# Altium footprint library ALL.PcbLib: 385 footprints (part 11 of 25)
Each footprint in its own frame and in the unit in brackets; x right, y up, seen from the top. Pads: shape width x height; smd on the part's side, far side on the other; paste and mask are expansions set on the pad; w line width, h text height; cw(c..) or ccw(c..) is an arc to the next point about the centre after c.
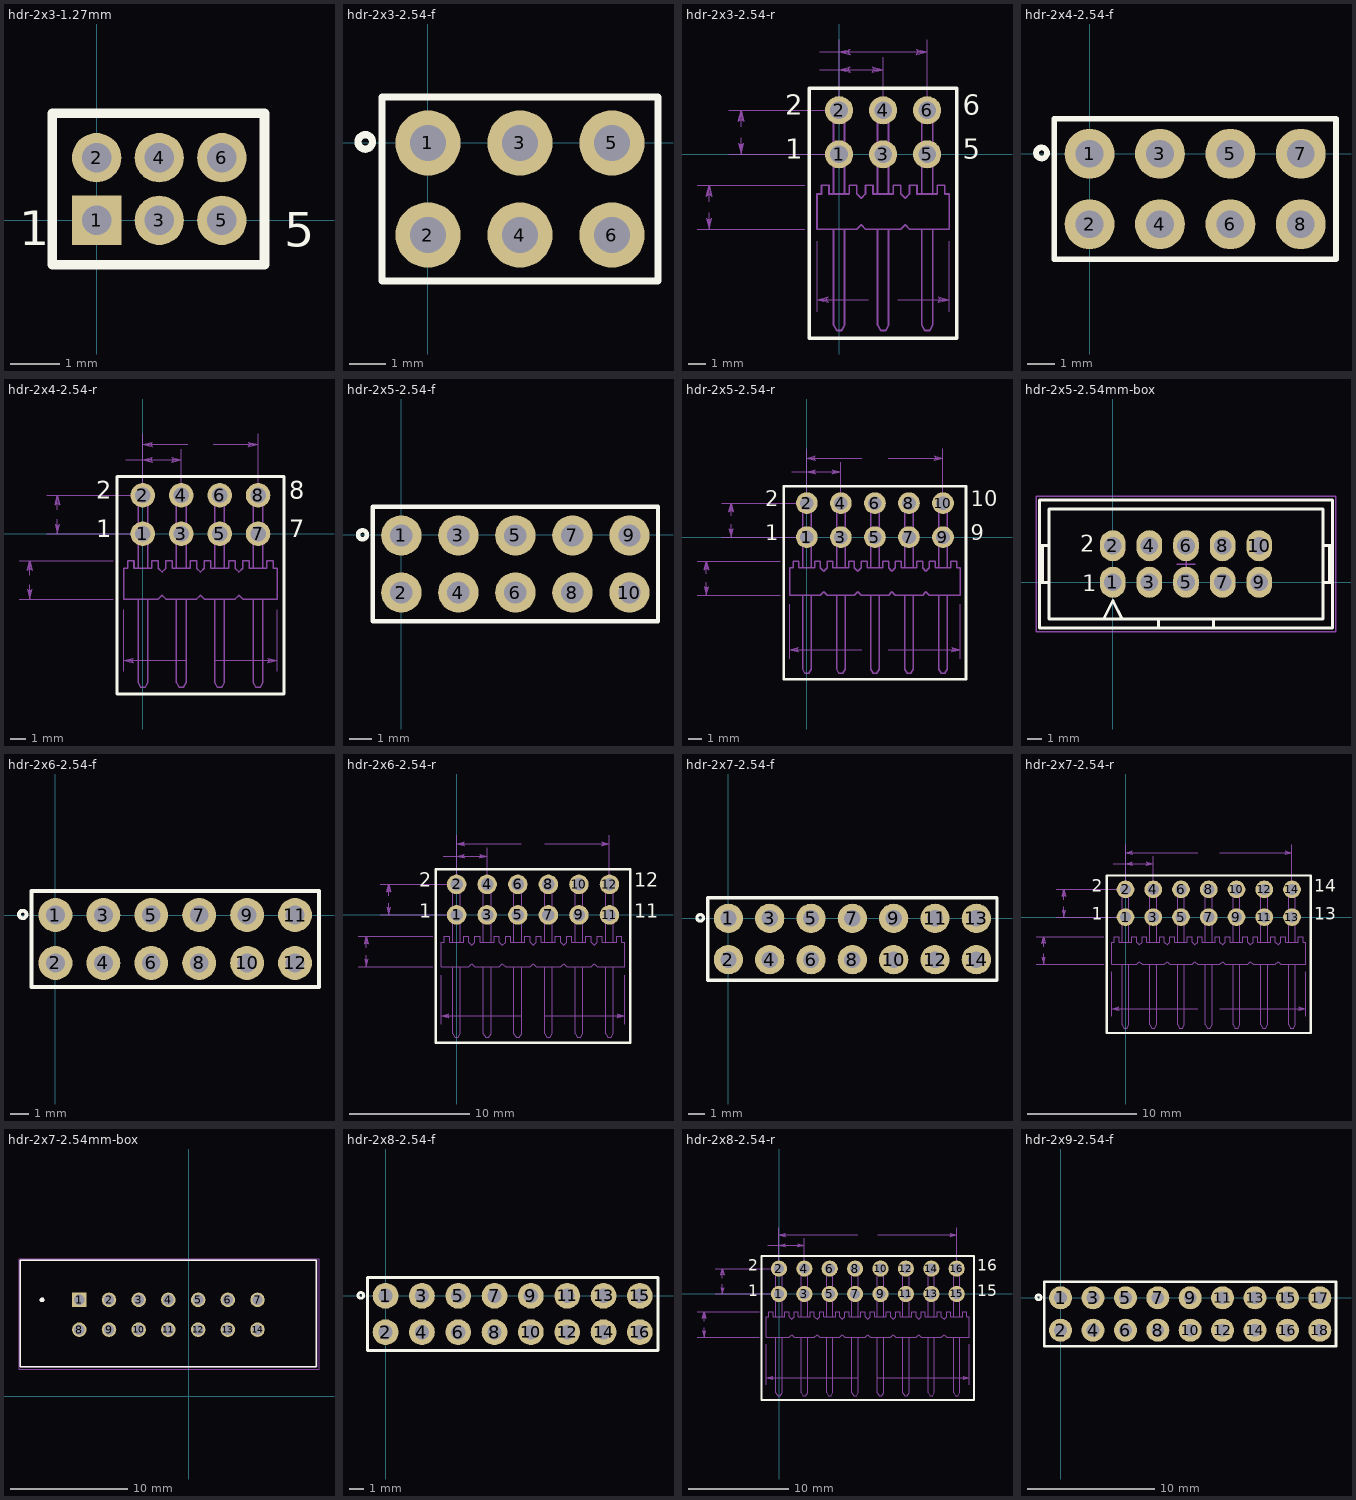
[diagram p10: the footprints below, top view; thin cyan lines are the x and y axes]

## hdr-2x3-1.27mm [mm]
pads (6):
  rect 1x1 hole 0.6: 1(0,0)
  round 1 hole 0.6: 2(0,1.27) 3(1.27,0) 4(1.27,1.27) 5(2.54,0) 6(2.54,1.27)
Top Overlay:
  lines w0.2: -0.9,-0.9 -0.9,2.17 3.404,2.17 3.404,-0.9 -0.9,-0.9
  text "1" at -1.575,-0.508 h0.7
  text "5" at 3.81,-0.533 h0.7
3D body "User Library-PLS6_2_1p27-1.STEP": height 4, standoff -2.3, extent -0.635,-1.09 3.175,2.31

## hdr-2x3-2.54-f [mm]
pads (6):
  round 1.8 hole 1: 1(0,0) 2(0,-2.54) 3(2.54,0) 4(2.54,-2.54) 5(5.08,0) 6(5.08,-2.54)
Top Overlay:
  circle w0.2: c-1.73,0.03 r0.2
  lines w0.2: -1.27,-3.81 -1.27,1.27 6.35,1.27 6.35,-3.81 -1.27,-3.81
3D body "PBD-2.stp": height 8.5, standoff -3.15, extent 3.81,-3.81 6.35,1.27
3D body "PBD-2.stp": height 8.5, standoff -3.15, extent -1.27,-3.81 1.27,1.27
3D body "PBD-2.stp": height 8.5, standoff -3.15, extent 1.27,-3.81 3.81,1.27

## hdr-2x3-2.54-r [mm]
pads (6):
  round 1.62 hole 1.02: 1(0,0) 2(0,2.54) 3(2.54,0) 4(2.54,2.54) 5(5.08,0) 6(5.08,2.54)
Top Overlay:
  lines w0.2: -1.72,-10.61 -1.72,3.801 6.8,3.801 6.8,-10.61 -1.72,-10.61
  text "1" at -3.09,-0.635 h1.97
  text "2" at -3.09,1.905 h1.97
  text "5" at 7.141,-0.635 h1.97
  text "6" at 7.141,1.905 h1.97
Top Solder:
  circle w0: c0,0 r0.861
  circle w0: c0,2.54 r0.861
  circle w0: c2.54,0 r0.861
  circle w0: c2.54,2.54 r0.861
  circle w0: c5.08,0 r0.861
  circle w0: c5.08,2.54 r0.861
Bottom Solder:
  circle w0: c0,0 r0.861
  circle w0: c0,2.54 r0.861
  circle w0: c2.54,0 r0.861
  circle w0: c2.54,2.54 r0.861
  circle w0: c5.08,0 r0.861
  circle w0: c5.08,2.54 r0.861
Mechanical 16:
  lines w0.1: -0.318,-4.318 -0.318,-9.855 -0.141,-10.16 0.141,-10.16 0.318,-9.855 0.318,-4.318 ; -0.318,-2.286 -0.318,2.596 0.318,2.596 0.318,-2.286 ; 2.222,-4.318 2.222,-9.855 2.399,-10.16 2.681,-10.16 2.858,-9.855 2.858,-4.318 ; 2.222,-2.286 2.222,2.596 2.858,2.596 2.858,-2.286 ; 4.762,-2.286 4.762,2.596 5.398,2.596 5.398,-2.286 ; 4.762,-4.318 4.762,-9.855 4.939,-10.16 5.221,-10.16 5.398,-9.855 5.398,-4.318 ; 4.762,-4.318 4.064,-4.318 3.81,-4.064 3.556,-4.318 1.524,-4.318 1.27,-4.064 1.016,-4.318 -1.27,-4.318 -1.27,-2.286 -1.016,-2.286 -1.016,-1.778 -0.587,-1.778 -0.587,-2.286 0.587,-2.286 0.587,-1.778 1.016,-1.778 1.016,-2.286 1.27,-2.54 1.524,-2.286 1.524,-1.778 1.953,-1.778 1.953,-2.286 3.127,-2.286 3.127,-1.778 3.556,-1.778 3.556,-2.286 3.81,-2.54 4.064,-2.286 4.064,-1.778 4.493,-1.778 4.493,-2.286 5.667,-2.286 5.667,-1.778 6.096,-1.778 6.096,-2.286 6.35,-2.286 6.35,-4.318 5.398,-4.318 ; 4.762,-4.318 5.398,-4.318
  text "1" at -3.09,-0.635 h1.97
  text "2" at -3.09,1.905 h1.97
  text "5" at 7.141,-0.635 h1.97
  text "6" at 7.141,1.905 h1.97
Mechanical 40:
  lines w0: -8.194,-4.318 -1.971,-4.318 ; -8.194,-1.778 -1.971,-1.778 ; -7.493,-3.366 -7.493,-4.318 ; -7.493,-2.73 -7.493,-1.778 ; -6.353,0 -0.701,0 ; -6.353,2.54 -0.701,2.54 ; -5.652,0.952 -5.652,0 ; -5.652,1.588 -5.652,2.54 ; -1.27,-9.083 -1.27,-5.019 ; -1.118,4.89 0,4.89 ; -1.118,5.906 0,5.906 ; 0,5.591 0,3.241 0,6.607 ; 1.689,-8.382 -1.27,-8.382 ; 2.54,3.241 2.54,5.591 ; 3.391,-8.382 6.35,-8.382 ; 5.08,3.241 5.08,6.607 ; 6.35,-9.083 6.35,-5.019 ; -7.652,-3.683 -7.493,-4.318 ; -7.652,-3.683 -7.493,-3.81 ; -7.652,-3.683 -7.572,-3.746 -7.493,-4.318 ; -7.493,-4.318 -7.334,-3.683 -7.493,-3.81 ; -7.493,-4.318 -7.414,-3.746 -7.493,-3.81 ; -7.493,-4.318 -7.493,-3.81 ; -7.493,-2.286 -7.652,-2.413 -7.493,-1.778 ; -7.493,-2.286 -7.334,-2.413 ; -7.493,-2.286 -7.572,-2.35 -7.493,-1.778 ; -7.493,-2.286 -7.493,-1.778 ; -7.493,-1.778 -7.334,-2.413 ; -7.493,-1.778 -7.414,-2.35 -7.334,-2.413 ; -5.81,0.635 -5.652,0 ; -5.81,0.635 -5.652,0.508 ; -5.81,0.635 -5.731,0.572 -5.652,0 ; -5.652,0 -5.493,0.635 -5.652,0.508 ; -5.652,0 -5.572,0.572 -5.652,0.508 ; -5.652,0 -5.652,0.508 ; -5.652,2.032 -5.81,1.905 -5.652,2.54 ; -5.652,2.032 -5.493,1.905 ; -5.652,2.032 -5.731,1.968 -5.652,2.54 ; -5.652,2.032 -5.652,2.54 ; -5.652,2.54 -5.493,1.905 ; -5.652,2.54 -5.572,1.968 -5.493,1.905 ; -1.27,-8.382 -0.635,-8.223 ; -1.27,-8.382 -0.635,-8.541 -0.762,-8.382 ; -1.27,-8.382 -0.698,-8.461 -0.762,-8.382 ; -1.27,-8.382 -0.762,-8.382 ; -1.27,-8.382 -0.698,-8.303 -0.635,-8.223 ; -0.762,-8.382 -0.635,-8.223 ; 0,4.89 0.635,5.048 ; 0,4.89 0.635,4.731 0.508,4.89 ; 0,4.89 0.572,4.81 0.508,4.89 ; 0,4.89 0.508,4.89 ; 0,4.89 0.572,4.969 0.635,5.048 ; 0,4.89 2.54,4.89 ; 0,5.906 0.635,6.064 ; 0,5.906 0.635,5.747 0.508,5.906 ; 0,5.906 0.572,5.826 0.508,5.906 ; 0,5.906 0.508,5.906 ; 0,5.906 0.572,5.985 0.635,6.064 ; 0,5.906 5.08,5.906 ; 0.508,4.89 0.635,5.048 ; 0.508,5.906 0.635,6.064 ; 1.905,4.731 2.54,4.89 ; 1.905,4.731 2.032,4.89 ; 1.905,4.731 1.968,4.81 2.54,4.89 ; 2.032,4.89 1.905,5.048 2.54,4.89 ; 2.032,4.89 1.968,4.969 2.54,4.89 ; 2.032,4.89 2.54,4.89 ; 4.445,5.747 5.08,5.906 ; 4.445,5.747 4.572,5.906 ; 4.445,5.747 4.508,5.826 5.08,5.906 ; 4.572,5.906 4.445,6.064 5.08,5.906 ; 4.572,5.906 4.508,5.985 5.08,5.906 ; 4.572,5.906 5.08,5.906 ; 5.715,-8.541 6.35,-8.382 ; 5.715,-8.541 5.842,-8.382 ; 5.715,-8.541 5.778,-8.461 6.35,-8.382 ; 5.842,-8.382 5.715,-8.223 6.35,-8.382 ; 5.842,-8.382 5.778,-8.303 6.35,-8.382 ; 5.842,-8.382 6.35,-8.382
  text "2.540" at -2.629,4.762 h0.39
  text "5.080" at -2.629,5.778 h0.39
  text "7.620" at 1.88,-8.509 h0.39
  text "2.540" at -8.153,-3.175 h0.39
  text "2.540" at -6.312,1.143 h0.39
3D body "TSW-103-08-S-D-RA.stp": height 6.35, standoff -1.5, extent -1.27,-9.906 6.35,2.858

## hdr-2x4-2.54-f [mm]
pads (8):
  round 1.8 hole 1: 1(0,0) 2(0,-2.54) 3(2.54,0) 4(2.54,-2.54) 5(5.08,0) 6(5.08,-2.54) 7(7.62,0) 8(7.62,-2.54)
Top Overlay:
  circle w0.2: c-1.73,0.03 r0.2
  lines w0.2: -1.27,-3.81 -1.27,1.27 8.89,1.27 8.89,-3.81 -1.27,-3.81
3D body "PBD-2.stp": height 8.5, standoff -3.15, extent 1.27,-3.81 3.81,1.27
3D body "PBD-2.stp": height 8.5, standoff -3.15, extent -1.27,-3.81 1.27,1.27
3D body "PBD-2.stp": height 8.5, standoff -3.15, extent 6.35,-3.81 8.89,1.27
3D body "PBD-2.stp": height 8.5, standoff -3.15, extent 3.81,-3.81 6.35,1.27

## hdr-2x4-2.54-r [mm]
pads (8):
  round 1.62 hole 1.02: 1(0,0) 2(0,2.54) 3(2.54,0) 4(2.54,2.54) 5(5.08,0) 6(5.08,2.54) 7(7.62,0) 8(7.62,2.54)
Top Overlay:
  lines w0.2: -1.72,-10.61 -1.72,3.801 9.34,3.801 9.34,-10.61 -1.72,-10.61
  text "1" at -3.09,-0.635 h1.97
  text "2" at -3.09,1.905 h1.97
  text "7" at 9.681,-0.635 h1.97
  text "8" at 9.681,1.905 h1.97
Top Solder:
  circle w0: c0,0 r0.861
  circle w0: c0,2.54 r0.861
  circle w0: c2.54,0 r0.861
  circle w0: c2.54,2.54 r0.861
  circle w0: c5.08,0 r0.861
  circle w0: c5.08,2.54 r0.861
  circle w0: c7.62,0 r0.861
  circle w0: c7.62,2.54 r0.861
Bottom Solder:
  circle w0: c0,0 r0.861
  circle w0: c0,2.54 r0.861
  circle w0: c2.54,0 r0.861
  circle w0: c2.54,2.54 r0.861
  circle w0: c5.08,0 r0.861
  circle w0: c5.08,2.54 r0.861
  circle w0: c7.62,0 r0.861
  circle w0: c7.62,2.54 r0.861
Mechanical 16:
  lines w0.1: -0.318,-4.318 -0.318,-9.855 -0.141,-10.16 0.141,-10.16 0.318,-9.855 0.318,-4.318 ; -0.318,-2.286 -0.318,2.596 0.318,2.596 0.318,-2.286 ; 2.222,-4.318 2.222,-9.855 2.399,-10.16 2.681,-10.16 2.858,-9.855 2.858,-4.318 ; 2.222,-2.286 2.222,2.596 2.858,2.596 2.858,-2.286 ; 4.762,-4.318 4.762,-9.855 4.939,-10.16 5.221,-10.16 5.398,-9.855 5.398,-4.318 ; 4.762,-2.286 4.762,2.596 5.398,2.596 5.398,-2.286 ; 7.302,-2.286 7.302,2.596 7.938,2.596 7.938,-2.286 ; 7.302,-4.318 7.302,-9.855 7.479,-10.16 7.761,-10.16 7.938,-9.855 7.938,-4.318 ; 7.302,-4.318 6.604,-4.318 6.35,-4.064 6.096,-4.318 4.064,-4.318 3.81,-4.064 3.556,-4.318 1.524,-4.318 1.27,-4.064 1.016,-4.318 -1.27,-4.318 -1.27,-2.286 -1.016,-2.286 -1.016,-1.778 -0.587,-1.778 -0.587,-2.286 0.587,-2.286 0.587,-1.778 1.016,-1.778 1.016,-2.286 1.27,-2.54 1.524,-2.286 1.524,-1.778 1.953,-1.778 1.953,-2.286 3.127,-2.286 3.127,-1.778 3.556,-1.778 3.556,-2.286 3.81,-2.54 4.064,-2.286 4.064,-1.778 4.493,-1.778 4.493,-2.286 5.667,-2.286 5.667,-1.778 6.096,-1.778 6.096,-2.286 6.35,-2.54 6.604,-2.286 6.604,-1.778 7.033,-1.778 7.033,-2.286 8.207,-2.286 8.207,-1.778 8.636,-1.778 8.636,-2.286 8.89,-2.286 8.89,-4.318 7.938,-4.318 ; 7.302,-4.318 7.938,-4.318
  text "1" at -3.09,-0.635 h1.97
  text "2" at -3.09,1.905 h1.97
  text "7" at 9.681,-0.635 h1.97
  text "8" at 9.681,1.905 h1.97
Mechanical 40:
  lines w0: -8.194,-4.318 -1.971,-4.318 ; -8.194,-1.778 -1.971,-1.778 ; -7.493,-3.366 -7.493,-4.318 ; -7.493,-2.73 -7.493,-1.778 ; -6.353,0 -0.701,0 ; -6.353,2.54 -0.701,2.54 ; -5.652,0.952 -5.652,0 ; -5.652,1.588 -5.652,2.54 ; -1.27,-9.083 -1.27,-5.019 ; -1.118,4.89 0,4.89 ; 0,5.591 0,3.241 0,6.607 ; 2.54,3.241 2.54,5.591 ; 2.819,-8.382 -1.27,-8.382 ; 2.959,5.906 0,5.906 ; 4.661,5.906 7.62,5.906 ; 4.801,-8.382 8.89,-8.382 ; 7.62,3.241 7.62,6.607 ; 8.89,-9.083 8.89,-5.019 ; -7.652,-3.683 -7.493,-4.318 ; -7.652,-3.683 -7.493,-3.81 ; -7.652,-3.683 -7.572,-3.746 -7.493,-4.318 ; -7.493,-4.318 -7.334,-3.683 -7.493,-3.81 ; -7.493,-4.318 -7.414,-3.746 -7.493,-3.81 ; -7.493,-4.318 -7.493,-3.81 ; -7.493,-2.286 -7.652,-2.413 -7.493,-1.778 ; -7.493,-2.286 -7.334,-2.413 ; -7.493,-2.286 -7.572,-2.35 -7.493,-1.778 ; -7.493,-2.286 -7.493,-1.778 ; -7.493,-1.778 -7.334,-2.413 ; -7.493,-1.778 -7.414,-2.35 -7.334,-2.413 ; -5.81,0.635 -5.652,0 ; -5.81,0.635 -5.652,0.508 ; -5.81,0.635 -5.731,0.572 -5.652,0 ; -5.652,0 -5.493,0.635 -5.652,0.508 ; -5.652,0 -5.572,0.572 -5.652,0.508 ; -5.652,0 -5.652,0.508 ; -5.652,2.032 -5.81,1.905 -5.652,2.54 ; -5.652,2.032 -5.493,1.905 ; -5.652,2.032 -5.731,1.968 -5.652,2.54 ; -5.652,2.032 -5.652,2.54 ; -5.652,2.54 -5.493,1.905 ; -5.652,2.54 -5.572,1.968 -5.493,1.905 ; -1.27,-8.382 -0.635,-8.223 ; -1.27,-8.382 -0.635,-8.541 -0.762,-8.382 ; -1.27,-8.382 -0.698,-8.461 -0.762,-8.382 ; -1.27,-8.382 -0.762,-8.382 ; -1.27,-8.382 -0.698,-8.303 -0.635,-8.223 ; -0.762,-8.382 -0.635,-8.223 ; 0,4.89 0.635,5.048 ; 0,4.89 0.635,4.731 0.508,4.89 ; 0,4.89 0.572,4.81 0.508,4.89 ; 0,4.89 0.508,4.89 ; 0,4.89 0.572,4.969 0.635,5.048 ; 0,4.89 2.54,4.89 ; 0,5.906 0.635,6.064 ; 0,5.906 0.635,5.747 0.508,5.906 ; 0,5.906 0.572,5.826 0.508,5.906 ; 0,5.906 0.508,5.906 ; 0,5.906 0.572,5.985 0.635,6.064 ; 0.508,4.89 0.635,5.048 ; 0.508,5.906 0.635,6.064 ; 1.905,4.731 2.54,4.89 ; 1.905,4.731 2.032,4.89 ; 1.905,4.731 1.968,4.81 2.54,4.89 ; 2.032,4.89 1.905,5.048 2.54,4.89 ; 2.032,4.89 1.968,4.969 2.54,4.89 ; 2.032,4.89 2.54,4.89 ; 6.985,5.747 7.62,5.906 ; 6.985,5.747 7.112,5.906 ; 6.985,5.747 7.048,5.826 7.62,5.906 ; 7.112,5.906 6.985,6.064 7.62,5.906 ; 7.112,5.906 7.048,5.985 7.62,5.906 ; 7.112,5.906 7.62,5.906 ; 8.255,-8.541 8.89,-8.382 ; 8.255,-8.541 8.382,-8.382 ; 8.255,-8.541 8.318,-8.461 8.89,-8.382 ; 8.382,-8.382 8.255,-8.223 8.89,-8.382 ; 8.382,-8.382 8.318,-8.303 8.89,-8.382 ; 8.382,-8.382 8.89,-8.382
  text "2.540" at -8.153,-3.175 h0.39
  text "2.540" at -6.312,1.143 h0.39
  text "2.540" at -2.629,4.762 h0.39
  text "10.160" at 3.01,-8.509 h0.39
  text "7.620" at 3.15,5.778 h0.39
3D body "TSW-104-25-T-D-RA.stp": height 5.54, standoff -2.56, extent -1.168,-12.148 8.992,2.902

## hdr-2x5-2.54-f [mm]
pads (10):
  round 1.8 hole 1: 1(0,-0.025) 2(0,-2.565) 3(2.54,-0.025) 4(2.54,-2.565) 5(5.08,-0.025) 6(5.08,-2.565) 7(7.62,-0.025) 8(7.62,-2.565) 9(10.16,-0.025) 10(10.16,-2.565)
Top Overlay:
  circle w0.2: c-1.73,0.005 r0.2
  lines w0.2: -1.27,-3.835 -1.27,1.245 11.43,1.245 11.43,-3.835 -1.27,-3.835
3D body "PBD-2.stp": height 8.5, standoff -3.15, extent 8.89,-3.835 11.43,1.245
3D body "PBD-2.stp": height 8.5, standoff -3.15, extent 3.81,-3.835 6.35,1.245
3D body "PBD-2.stp": height 8.5, standoff -3.15, extent 6.35,-3.835 8.89,1.245
3D body "PBD-2.stp": height 8.5, standoff -3.15, extent -1.27,-3.835 1.27,1.245
3D body "PBD-2.stp": height 8.5, standoff -3.15, extent 1.27,-3.835 3.81,1.245

## hdr-2x5-2.54-r [mm]
pads (10):
  round 1.62 hole 1.02: 1(0,0) 2(0,2.54) 3(2.54,0) 4(2.54,2.54) 5(5.08,0) 6(5.08,2.54) 7(7.62,0) 8(7.62,2.54) 9(10.16,0) 10(10.16,2.54)
Top Overlay:
  lines w0.2: -1.72,-10.61 11.88,-10.61 11.88,3.801 -1.72,3.801 -1.72,-10.61
  text "10" at 12.221,1.905 h1.97
  text "9" at 12.221,-0.635 h1.97
  text "2" at -3.09,1.905 h1.97
  text "1" at -3.09,-0.635 h1.97
Top Solder:
  circle w0: c10.16,2.54 r0.861
  circle w0: c10.16,0 r0.861
  circle w0: c7.62,2.54 r0.861
  circle w0: c7.62,0 r0.861
  circle w0: c5.08,2.54 r0.861
  circle w0: c5.08,0 r0.861
  circle w0: c2.54,2.54 r0.861
  circle w0: c2.54,0 r0.861
  circle w0: c0,2.54 r0.861
  circle w0: c0,0 r0.861
Bottom Solder:
  circle w0: c10.16,2.54 r0.861
  circle w0: c10.16,0 r0.861
  circle w0: c7.62,2.54 r0.861
  circle w0: c7.62,0 r0.861
  circle w0: c5.08,2.54 r0.861
  circle w0: c5.08,0 r0.861
  circle w0: c2.54,2.54 r0.861
  circle w0: c2.54,0 r0.861
  circle w0: c0,2.54 r0.861
  circle w0: c0,0 r0.861
Mechanical 16:
  lines w0.1: -0.318,-4.318 -0.318,-9.855 -0.141,-10.16 0.141,-10.16 0.318,-9.855 0.318,-4.318 ; -0.318,-2.286 -0.318,2.596 0.318,2.596 0.318,-2.286 ; 2.222,-4.318 2.222,-9.855 2.399,-10.16 2.681,-10.16 2.858,-9.855 2.858,-4.318 ; 2.222,-2.286 2.222,2.596 2.858,2.596 2.858,-2.286 ; 4.762,-4.318 4.762,-9.855 4.939,-10.16 5.221,-10.16 5.398,-9.855 5.398,-4.318 ; 4.762,-2.286 4.762,2.596 5.398,2.596 5.398,-2.286 ; 7.302,-4.318 7.302,-9.855 7.479,-10.16 7.761,-10.16 7.938,-9.855 7.938,-4.318 ; 7.302,-2.286 7.302,2.596 7.938,2.596 7.938,-2.286 ; 9.842,-2.286 9.842,2.596 10.478,2.596 10.478,-2.286 ; 9.842,-4.318 10.478,-4.318 ; 9.842,-4.318 9.144,-4.318 8.89,-4.064 8.636,-4.318 6.604,-4.318 6.35,-4.064 6.096,-4.318 4.064,-4.318 3.81,-4.064 3.556,-4.318 1.524,-4.318 1.27,-4.064 1.016,-4.318 -1.27,-4.318 -1.27,-2.286 -1.016,-2.286 -1.016,-1.778 -0.587,-1.778 -0.587,-2.286 0.587,-2.286 0.587,-1.778 1.016,-1.778 1.016,-2.286 1.27,-2.54 1.524,-2.286 1.524,-1.778 1.953,-1.778 1.953,-2.286 3.127,-2.286 3.127,-1.778 3.556,-1.778 3.556,-2.286 3.81,-2.54 4.064,-2.286 4.064,-1.778 4.493,-1.778 4.493,-2.286 5.667,-2.286 5.667,-1.778 6.096,-1.778 6.096,-2.286 6.35,-2.54 6.604,-2.286 6.604,-1.778 7.033,-1.778 7.033,-2.286 8.207,-2.286 8.207,-1.778 8.636,-1.778 8.636,-2.286 8.89,-2.54 9.144,-2.286 9.144,-1.778 9.573,-1.778 9.573,-2.286 10.747,-2.286 10.747,-1.778 11.176,-1.778 11.176,-2.286 11.43,-2.286 11.43,-4.318 10.478,-4.318 ; 9.842,-4.318 9.842,-9.855 10.019,-10.16 10.301,-10.16 10.478,-9.855 10.478,-4.318
  text "10" at 12.221,1.905 h1.97
  text "9" at 12.221,-0.635 h1.97
  text "2" at -3.09,1.905 h1.97
  text "1" at -3.09,-0.635 h1.97
Mechanical 40:
  lines w0: -8.194,-4.318 -1.971,-4.318 ; -8.194,-1.778 -1.971,-1.778 ; -7.493,-3.366 -7.493,-4.318 ; -7.493,-2.73 -7.493,-1.778 ; -6.353,0 -0.701,0 ; -6.353,2.54 -0.701,2.54 ; -5.652,0.952 -5.652,0 ; -5.652,1.588 -5.652,2.54 ; -1.27,-9.083 -1.27,-5.019 ; -1.118,4.89 0,4.89 ; 0,5.591 0,3.241 0,6.607 ; 2.54,3.241 2.54,5.591 ; 4.089,-8.382 -1.27,-8.382 ; 4.089,5.906 0,5.906 ; 6.071,-8.382 11.43,-8.382 ; 6.071,5.906 10.16,5.906 ; 10.16,3.241 10.16,6.607 ; 11.43,-9.083 11.43,-5.019 ; -7.652,-3.683 -7.572,-3.746 -7.493,-4.318 ; -7.652,-3.683 -7.493,-3.81 ; -7.652,-3.683 -7.493,-4.318 ; -7.493,-4.318 -7.493,-3.81 ; -7.493,-4.318 -7.414,-3.746 -7.493,-3.81 ; -7.493,-4.318 -7.334,-3.683 -7.493,-3.81 ; -7.493,-2.286 -7.493,-1.778 ; -7.493,-2.286 -7.572,-2.35 -7.493,-1.778 ; -7.493,-2.286 -7.334,-2.413 ; -7.493,-2.286 -7.652,-2.413 -7.493,-1.778 ; -7.493,-1.778 -7.414,-2.35 -7.334,-2.413 ; -7.493,-1.778 -7.334,-2.413 ; -5.81,0.635 -5.731,0.572 -5.652,0 ; -5.81,0.635 -5.652,0.508 ; -5.81,0.635 -5.652,0 ; -5.652,0 -5.652,0.508 ; -5.652,0 -5.572,0.572 -5.652,0.508 ; -5.652,0 -5.493,0.635 -5.652,0.508 ; -5.652,2.032 -5.652,2.54 ; -5.652,2.032 -5.731,1.968 -5.652,2.54 ; -5.652,2.032 -5.493,1.905 ; -5.652,2.032 -5.81,1.905 -5.652,2.54 ; -5.652,2.54 -5.572,1.968 -5.493,1.905 ; -5.652,2.54 -5.493,1.905 ; -1.27,-8.382 -0.698,-8.303 -0.635,-8.223 ; -1.27,-8.382 -0.762,-8.382 ; -1.27,-8.382 -0.698,-8.461 -0.762,-8.382 ; -1.27,-8.382 -0.635,-8.541 -0.762,-8.382 ; -1.27,-8.382 -0.635,-8.223 ; -0.762,-8.382 -0.635,-8.223 ; 0,4.89 2.54,4.89 ; 0,4.89 0.572,4.969 0.635,5.048 ; 0,4.89 0.508,4.89 ; 0,4.89 0.572,4.81 0.508,4.89 ; 0,4.89 0.635,4.731 0.508,4.89 ; 0,4.89 0.635,5.048 ; 0,5.906 0.572,5.985 0.635,6.064 ; 0,5.906 0.508,5.906 ; 0,5.906 0.572,5.826 0.508,5.906 ; 0,5.906 0.635,5.747 0.508,5.906 ; 0,5.906 0.635,6.064 ; 0.508,4.89 0.635,5.048 ; 0.508,5.906 0.635,6.064 ; 1.905,4.731 1.968,4.81 2.54,4.89 ; 1.905,4.731 2.032,4.89 ; 1.905,4.731 2.54,4.89 ; 2.032,4.89 2.54,4.89 ; 2.032,4.89 1.968,4.969 2.54,4.89 ; 2.032,4.89 1.905,5.048 2.54,4.89 ; 9.525,5.747 9.588,5.826 10.16,5.906 ; 9.525,5.747 9.652,5.906 ; 9.525,5.747 10.16,5.906 ; 9.652,5.906 10.16,5.906 ; 9.652,5.906 9.588,5.985 10.16,5.906 ; 9.652,5.906 9.525,6.064 10.16,5.906 ; 10.795,-8.541 10.858,-8.461 11.43,-8.382 ; 10.795,-8.541 10.922,-8.382 ; 10.795,-8.541 11.43,-8.382 ; 10.922,-8.382 11.43,-8.382 ; 10.922,-8.382 10.858,-8.303 11.43,-8.382 ; 10.922,-8.382 10.795,-8.223 11.43,-8.382
  text "10.160" at 4.28,5.778 h0.39
  text "12.700" at 4.28,-8.509 h0.39
  text "2.540" at -2.629,4.762 h0.39
  text "2.540" at -6.312,1.143 h0.39
  text "2.540" at -8.153,-3.175 h0.39
3D body "TSW-105-25-T-D-RA.stp": height 5.54, standoff -2.56, extent -1.219,-12.198 11.481,2.851
